# Altium footprint library chipfc_libs.PCBLIB: 337 footprints (part 6 of 22)
Each footprint in its own frame and in the unit in brackets; x right, y up, seen from the top. Pads: shape width x height; smd on the part's side, far side on the other; paste and mask are expansions set on the pad; w line width, h text height; cw(c..) or ccw(c..) is an arc to the next point about the centre after c.
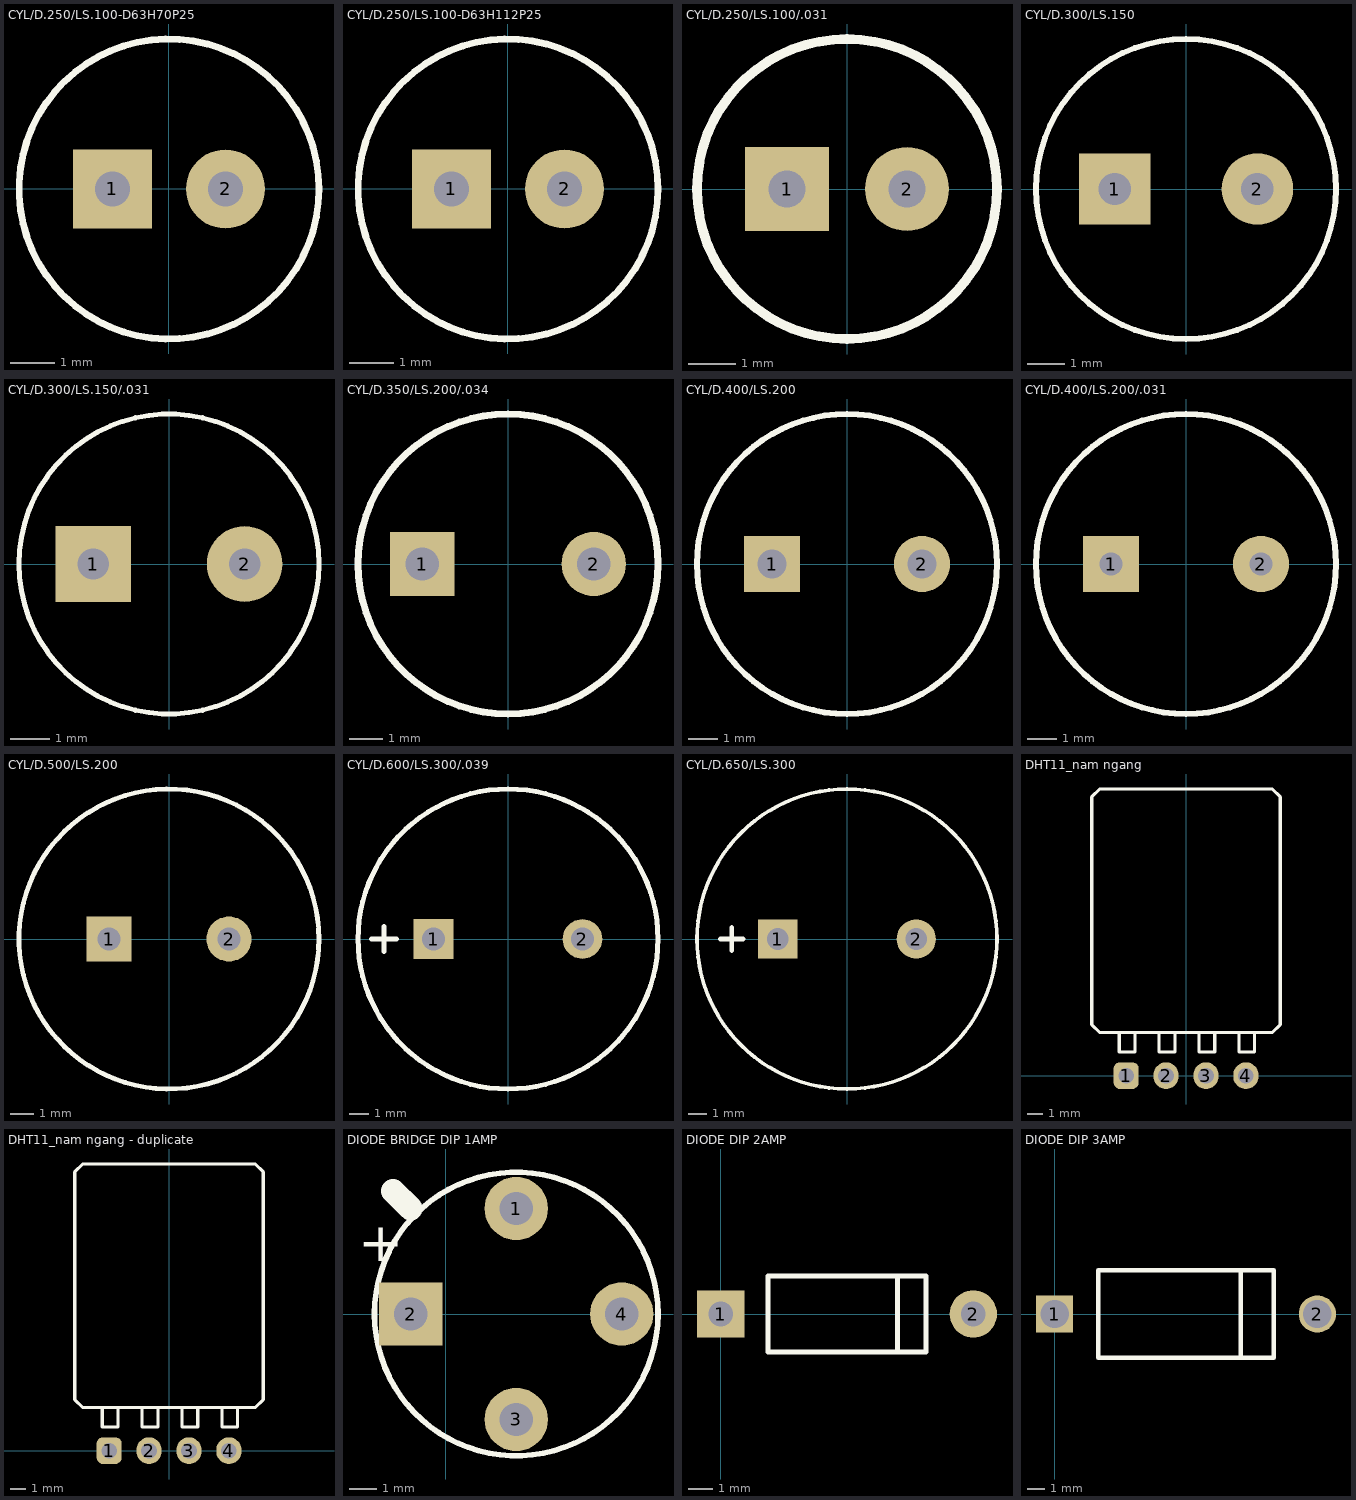
[diagram p5: the footprints below, top view; thin cyan lines are the x and y axes]

## CYL/D.250/LS.100-D63H70P25 [mil]
pads (2):
  rect 70x70 hole 31: 1(-50,0)
  round 70 hole 31: 2(50,0)
Top Overlay:
  circle w6: c0,0 r132.72
3D body "CapAluRadial_D63H70P25.step": height 275.63, standoff -118.11, extent -124.02,-124.01 124.05,124.01

## CYL/D.250/LS.100-D63H112P25 [mil]
pads (2):
  rect 70x70 hole 31: 1(-50,0)
  round 70 hole 31: 2(50,0)
Top Overlay:
  circle w6: c0,0 r132.72
3D body "CapAluRadial_D63H112P25.step": height 440.98, standoff -118.11, extent -124.02,-124.01 124.05,124.01

## CYL/D.250/LS.100/.031 [mil]
pads (2):
  rect 70x70 hole 31: 1(-50,0)
  round 70 hole 31: 2(50,0)
Top Overlay:
  lines w8: -125,0 cw(c0,0) 0,125 cw(c0,0) 125,0 cw(c0,0) 0,-125 cw(c0,0) -125,0

## CYL/D.300/LS.150 [mil]
pads (2):
  rect 75x75 hole 34: 1(-75,0)
  round 75 hole 34: 2(75,0)
Top Overlay:
  circle w6: c0,0 r157.49
3D body "CircuitWorks-ELECTROLITIC CAPACITOR RADIAL 8X12.step": height 472.44, standoff -98.43, extent -157.48,-157.48 157.49,157.49

## CYL/D.300/LS.150/.031 [mil]
pads (2):
  rect 75x75 hole 31: 1(-75,0)
  round 75 / inner round 60 / far side round 75 hole 31: 2(75,0)
Top Overlay:
  circle w5: c0,0 r148.66

## CYL/D.350/LS.200/.034 [mil]
pads (2):
  rect 75x75 hole 39: 1(-100,0)
  round 75 hole 39: 2(100,0)
Top Overlay:
  lines w8: -175,0 cw(c0,0) 0,175 cw(c0,0) 175,0 cw(c0,0) 0,-175 cw(c0,0) -175,0

## CYL/D.400/LS.200 [mil]
pads (2):
  rect 75x75 hole 39: 1(-100,0)
  round 75 hole 39: 2(100,0)
Top Overlay:
  lines w8: -200,0 ccw(c0,0) 0,-200 ccw(c0,0) 200,0 ccw(c0,0) 0,200 ccw(c0,0) -200,0
3D body "User Library-CE_R200_D400_H500.step": height 500, standoff -106.3, extent -198.38,-199.3 200,199.32

## CYL/D.400/LS.200/.031 [mil]
pads (2):
  rect 75x75 / inner round 60 / far side rect 75x75 hole 31: 1(-100,0)
  round 75 / inner round 60 / far side round 75 hole 31: 2(100,0)
Top Overlay:
  lines w8: -200,0 ccw(c0,0) 0,-200 ccw(c0,0) 200,0 ccw(c0,0) 0,200 ccw(c0,0) -200,0

## CYL/D.500/LS.200 [mil]
pads (2):
  rect 75x75 hole 39: 1(-100,0)
  round 75 hole 39: 2(100,0)
Top Overlay:
  circle w8: c0,0 r250
3D body "User Library-CapAluRadial_D125H200.STEP": height 866.14, standoff -118.11, extent -255.9,-255.12 253.72,255.12

## CYL/D.600/LS.300/.039 [mil]
pads (2):
  rect 80x80 hole 47.24: 1(-150,0)
  round 80 hole 47.24: 2(150,0)
Top Overlay:
  circle w10: c0,0 r302.08
  lines w10: -275,0 -225,0 ; -250,-25 -250,25

## CYL/D.650/LS.300 [mil]
pads (2):
  rect 85x85 hole 47.24: 1(-150,0)
  round 85 hole 47.24: 2(150,0)
Top Overlay:
  circle w8: c0,0 r325
  lines w10: -275,0 -225,0 ; -250,-25 -250,25
3D body "User Library-CE_R300_D650_H1000.step": height 1000, standoff -137.8, extent -324.13,-324.03 324.8,324.04

## DHT11_nam ngang [mm] "Cam bien do am va nhiet do"
height 5.5
pads (4):
  rrect50% 1.6x1.7 hole 1: 1(-3.81,0)
  oval 1.6x1.7 hole 1: 2(-1.27,0) 3(1.27,0) 4(3.81,0)
Top Overlay:
  lines w0.2: -4.25,2.75 -4.25,1.5 -3.25,1.5 -3.25,2.75 ; -1.71,2.75 -1.71,1.5 -0.71,1.5 -0.71,2.75 ; 0.83,2.75 0.83,1.5 1.83,1.5 1.83,2.75 ; 3.37,2.75 3.37,1.5 4.37,1.5 4.37,2.75 ; -6,3.25 -6,17.75 -5.5,18.25 5.5,18.25 6,17.75 6,3.25 5.5,2.75 -5.5,2.75 -6,3.25
3D body "User Library-DHT11-right.step": height 5.5, standoff -2.6, extent -6,-0.4 6,18.1

## DHT11_nam ngang - duplicate [mm] "Cam bien do am va nhiet do"
height 5.5
pads (4):
  rrect50% 1.6x1.7 hole 1: 1(-3.81,0)
  oval 1.6x1.7 hole 1: 2(-1.27,0) 3(1.27,0) 4(3.81,0)
Top Overlay:
  lines w0.2: -4.25,2.75 -4.25,1.5 -3.25,1.5 -3.25,2.75 ; -1.71,2.75 -1.71,1.5 -0.71,1.5 -0.71,2.75 ; 0.83,2.75 0.83,1.5 1.83,1.5 1.83,2.75 ; 3.37,2.75 3.37,1.5 4.37,1.5 4.37,2.75 ; -6,3.25 -6,17.75 -5.5,18.25 5.5,18.25 6,17.75 6,3.25 5.5,2.75 -5.5,2.75 -6,3.25
3D body "User Library-DHT11-right.step": height 5.5, standoff -2.6, extent -6,-0.4 6,18.1

## DIODE BRIDGE DIP 1AMP [mil]
pads (4):
  round 90 hole 47.23: 1(100,150)
  rect 90x90 hole 47.23: 2(-50,0)
  round 90 hole 47: 3(100,-150) 4(250,0)
Top Overlay:
  circle w8: c100,0 r201.56
  lines w34: -75,175 -50,150 -62.5,162.5
  text "+" at -125,75 h56.25

## DIODE DIP 2AMP [mil]
pads (2):
  rect 75x75 hole 39: 1(0,0)
  round 75 hole 39: 2(400,0)
Top Overlay:
  lines w8: 280,-60 280,60 ; 75,-60 325,-60 325,60 75,60 75,-60

## DIODE DIP 3AMP [mil]
pads (2):
  rect 85x85 hole 65: 1(0,0)
  round 85 hole 65: 2(600,0)
Top Overlay:
  lines w10: 425,-100 425,100 ; 100,-100 500,-100 500,100 100,100 100,-100